# Altium footprint library DrPCB.PcbLib: 910 footprints (part 41 of 57)
Each footprint in its own frame and in the unit in brackets; x right, y up, seen from the top. Pads: shape width x height; smd on the part's side, far side on the other; paste and mask are expansions set on the pad; w line width, h text height; cw(c..) or ccw(c..) is an arc to the next point about the centre after c.
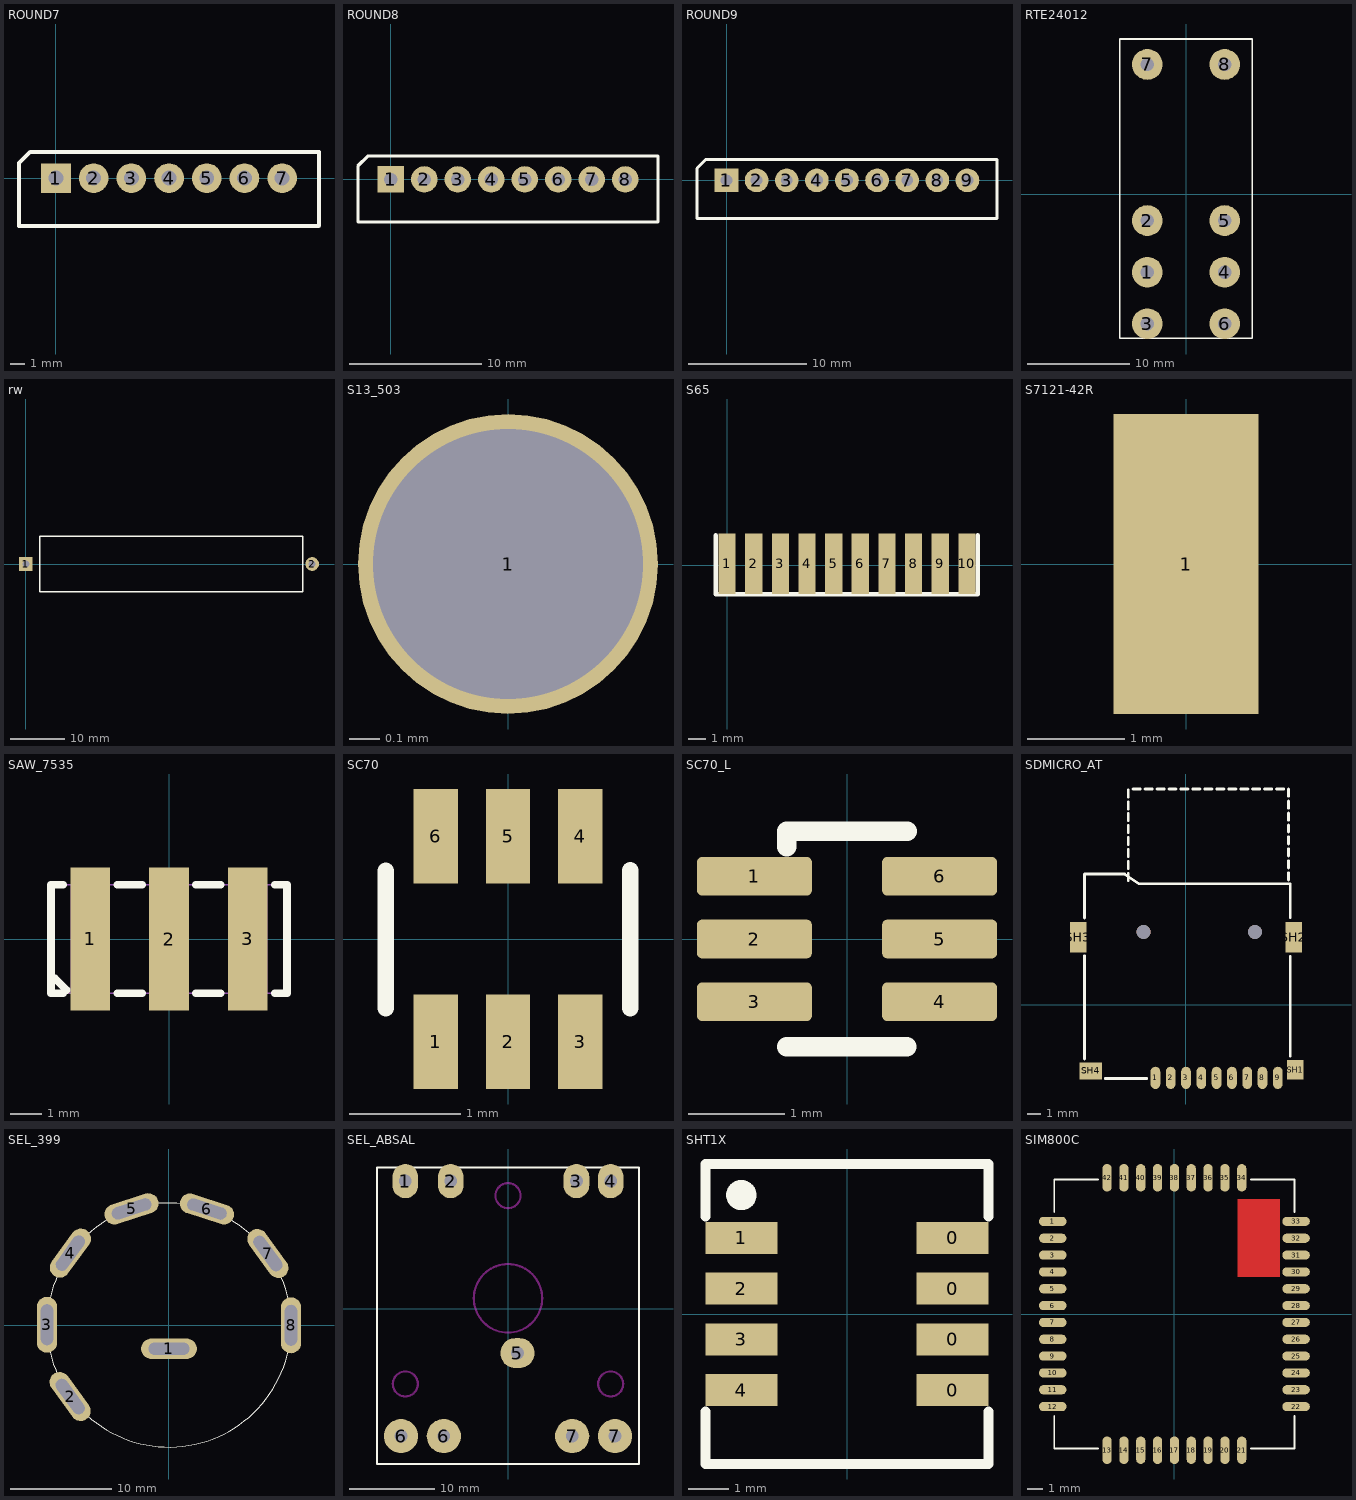
[diagram p40: the footprints below, top view; thin cyan lines are the x and y axes]

## ROUND7 [mm]
pads (7):
  rect 2x2 hole 1: 1(-0.004,-0.009)
  round 2 hole 1: 2(2.536,-0.009) 3(5.076,-0.009) 4(7.616,-0.009) 5(10.156,-0.009) 6(12.696,-0.009) 7(15.236,-0.009)
Top Overlay:
  lines w0.254: -2.492,-3.241 -2.492,1.008 -1.741,1.759 17.719,1.759 17.719,-3.223 17.701,-3.241 -2.492,-3.241

## ROUND8 [mm]
pads (8):
  rect 2x2 hole 1: 1(-0.004,0.004)
  round 2 hole 1: 2(2.536,0.004) 3(5.076,0.004) 4(7.616,0.004) 5(10.156,0.004) 6(12.696,0.004) 7(15.236,0.004) 8(17.776,0.004)
Top Overlay:
  lines w0.254: 20.244,-3.228 -2.492,-3.228 -2.492,1.021 -1.741,1.772 20.244,1.772 ; 20.259,-3.228 20.259,1.772

## ROUND9 [mm]
pads (9):
  rect 2x2 hole 1: 1(-0.004,0.004)
  round 2 hole 1: 2(2.536,0.004) 3(5.076,0.004) 4(7.616,0.004) 5(10.156,0.004) 6(12.696,0.004) 7(15.236,0.004) 8(17.776,0.004) 9(20.316,0.004)
Top Overlay:
  lines w0.254: 22.796,-3.228 -2.492,-3.228 -2.492,1.021 -1.741,1.772 22.809,1.772 ; 22.799,-3.228 22.799,1.772

## RTE24012 [mm]
pads (8):
  round 3 hole 1.3 mask+0: 1(-3.78,-7.63) 2(-3.78,-2.59) 3(-3.78,-12.67) 4(3.78,-7.63) 5(3.78,-2.59) 6(3.78,-12.67) 7(-3.78,12.67) 8(3.78,12.67)
Top Overlay:
  lines w0.152: -6.477,-14.102 6.477,-14.102 6.477,15.159 -6.477,15.159 -6.477,-14.102
3D body "RELAY-SPDT_5mm.step": height 15.7, standoff -2.54, extent -6.35,-13.975 6.35,15.032

## rw [mm]
pads (2):
  rect 2.5x2.5 hole 1.3: 1(0,0)
  round 2.5 hole 1.3: 2(52.5,0)
Top Overlay:
  lines w0.254: 2.54,-5.08 2.54,5.08 50.8,5.08 50.8,-5.08 2.54,-5.08

## S13_503 [mm]
pads (1):
  round 1 hole 0.9: 1(0,0)
3D body "s13-503.stp": height 12.6, standoff -5.15, extent -0.483,-0.483 0.483,0.483

## S65 [mm]
pads (10):
  rect 1x3.5 smd: 1(-0.021,0.1) 2(1.529,0.1) 3(3.079,0.1) 4(4.629,0.1) 5(6.179,0.1) 6(7.729,0.1) 7(9.279,0.1) 8(10.829,0.1) 9(12.379,0.1) 10(13.929,0.1)
Top Overlay:
  lines w0.254: -0.682,1.751 -0.682,-1.678 14.558,-1.678 14.558,1.751

## S7121-42R [mm]
pads (1):
  rect 1.5x3.1 smd: 1(0,0)
3D body "s7121-42r.stp": height 1.71, standoff 0.01, extent -0.75,-1.348 0.75,1.348

## SAW_7535 [mm]
pads (3):
  rect 1.28x4.6 smd paste+0 mask+0.05: 1(-2.54,0) 2(0,0) 3(2.54,0)
Top Overlay:
  lines w0.254: -3.81,-1.27 -3.683,-1.27 -3.302,-1.651 ; -3.411,-1.75 -3.81,-1.75 -3.81,1.75 -3.411,1.75 ; -1.669,-1.75 -0.871,-1.75 ; -1.669,1.75 -0.871,1.75 ; 0.871,-1.75 1.669,-1.75 ; 0.871,1.75 1.669,1.75 ; 3.411,-1.75 3.81,-1.75 3.81,1.75 3.411,1.75
Mechanical 15:
  region: 1.905,1.75 3.175,1.75 3.175,-1.75 1.905,-1.75
  region: -0.635,1.75 0.635,1.75 0.635,-1.75 -0.635,-1.75
  region: -3.175,1.75 -1.905,1.75 -1.905,-1.75 -3.175,-1.75
  region: -3.69,1.75 -3.69,1.775 -3.725,1.81 -3.775,1.81 -3.81,1.775 -3.81,1.75 -3.81,1.725 -3.775,1.69 -3.725,1.69 -3.69,1.725
  lines w0.051: -3.75,-1.75 3.75,-1.75 3.75,1.75 -3.75,1.75 -3.75,-1.75
3D body "User Library-CSTCC2M00GZ6A02-R0.step": height 1.25, standoff 0, extent -3.6,-1.5 3.6,1.5

## SC70 [mm]
pads (6):
  rect 0.4x0.85 smd: 1(-0.65,-0.925) 2(0,-0.925) 3(0.65,-0.925) 4(0.65,0.925) 5(0,0.925) 6(-0.65,0.925)
Top Overlay:
  lines w0.15: -1.1,-0.624 -1.1,0.613 ; 1.1,-0.624 1.1,0.62
3D body "User Library-SOT363-2.step": height 1.1, standoff 0, extent -1.1,-1.2 1.1,1.2

## SC70_L [mm]
pads (6):
  rrect25% 1.19x0.4 smd: 1(-0.96,0.65) 2(-0.96,0) 3(-0.96,-0.65) 4(0.96,-0.65) 5(0.96,0) 6(0.96,0.65)
Top Overlay:
  lines w0.2: -0.628,-1.118 0.622,-1.118 ; -0.625,0.955 -0.625,1.118 0.625,1.118
3D body "SN74LVC1T45DCKR--3DModel-STEP-1.STEP": height 1.1, standoff 0, extent -1.05,-1 1.05,1

## SDMICRO_AT [mm] "SDMICRO exist on Iran, Attend 112J-TDAR-R01 push-push"
height 1
pads (15):
  oval 0.7x1.6 smd: 1(-2.2,-5.25) 2(-1.1,-5.25) 3(0,-5.25) 4(1.1,-5.25) 5(2.2,-5.25) 6(3.3,-5.25) 7(4.4,-5.25) 8(5.5,-5.25) 9(6.6,-5.25)
  rect 1.2x1.4 smd: SH1(7.85,-4.65)
  rect 1.2x2.2 smd: SH2(7.75,4.85) SH3(-7.75,4.85)
  rect 1.6x1.2 smd: SH4(-6.85,-4.75)
  round 1 hole 1 unplated: ""(-3.05,5.25) ""(4.95,5.25)
Top Overlay:
  lines w0.2: -7.3,-3.9 -7.3,3.53 ; -7.3,6.25 -7.3,9.4 -4.409,9.4 -3.399,8.7 7.5,8.7 7.5,6.26 ; -5.8,-5.3 -2.82,-5.3 ; -4.16,8.93 -4.16,9.45 ; -4.16,9.79 -4.16,10.31 ; -4.16,10.65 -4.16,11.17 ; -4.16,11.51 -4.16,12.03 ; -4.16,12.37 -4.16,12.89 ; -4.16,13.23 -4.16,13.75 ; -4.16,14.09 -4.16,14.61 ; -4.16,14.95 -4.16,15.47 ; -3.81,15.52 -3.29,15.52 ; -2.95,15.52 -2.43,15.52 ; -2.09,15.52 -1.57,15.52 ; -1.23,15.52 -0.71,15.52 ; -0.37,15.52 0.15,15.52 ; 0.49,15.52 1.01,15.52 ; 1.35,15.52 1.87,15.52 ; 2.21,15.52 2.73,15.52 ; 3.07,15.52 3.59,15.52 ; 3.93,15.52 4.45,15.52 ; 4.79,15.52 5.31,15.52 ; 5.65,15.52 6.17,15.52 ; 6.51,15.52 7.03,15.52 ; 7.37,8.98 7.37,9.5 ; 7.37,9.84 7.37,10.36 ; 7.37,10.7 7.37,11.22 ; 7.37,11.56 7.37,12.08 ; 7.37,12.42 7.37,12.94 ; 7.37,13.28 7.37,13.8 ; 7.37,14.14 7.37,14.66 ; 7.37,15 7.37,15.52 ; 7.5,-3.7 7.5,3.5
3D body "112J-TXAR-R_C_1.stp": height 1.85, standoff -0.6, extent -8,-5.702 8.1,9.3
3D body "User Library-Micro_SD.step": height 1.15, standoff 0.17, extent -3.976,-1.179 7.024,13.821

## SEL_399 [mm]
pads (8):
  oval 5.5x2 hole 1.2 slot 4 at 0 deg: 1(0,-2.328)
  oval 5.5x2 hole 1.2 slot 4 at 126 deg rot 126: 2(-9.724,-7.034) 7(9.724,7.034)
  oval 2x5.5 hole 1.2 slot 4 at 90 deg: 3(-12.002,0.025) 8(12.002,-0.025)
  oval 5.5x2 hole 1.2 slot 4 at 54 deg rot 54: 4(-9.694,7.075)
  oval 5.5x2 hole 1.2 slot 4 at 18 deg rot 18: 5(-3.685,11.422)
  oval 5.5x2 hole 1.2 slot 4 at 162 deg rot 162: 6(3.733,11.406)
Top Overlay:
  circle w0.1: c0,0 r12

## SEL_ABSAL [mm]
pads (9):
  oval 3x4 hole 1.5: 1(-12,14.9) 2(-6.7,14.9) 3(8,14.9) 4(12,14.9)
  oval 4x3.5 hole 1.5: 5(1.1,-5.2)
  round 4 hole 1.5: 6(-12.5,-14.9) 6(-7.5,-14.9) 7(7.5,-14.9) 7(12.5,-14.9)
Top Overlay:
  lines w0.254: -15.3,-18.161 -15.3,16.5 15.3,16.5 15.3,-18.161 -15.3,-18.161
Keep-Out Layer:
  circle w0.254: c0,1.2 r4
  circle w0.254: c12,-8.8 r1.462
  circle w0.254: c-12,-8.8 r1.462
  circle w0.254: c0,13.2 r1.462
3D body: height 26.5, standoff 0, extent -15.342,-18.212 15.253,16.485
3D body: height 45, standoff 0, extent -15.342,1.486 15.253,16.485

## SHT1X [mm]
pads (8):
  rect 1.8x0.8 smd: 0(2.64,-1.905) 0(2.64,-0.635) 0(2.64,0.635) 0(2.64,1.905) 1(-2.64,1.905) 2(-2.64,0.635) 3(-2.64,-0.635) 4(-2.64,-1.905)
Top Overlay:
  circle w0.5: c-2.642,2.972 r0.128
  lines w0.254: -3.54,-2.442 -3.54,-3.75 3.54,-3.75 3.54,-2.442 ; -3.54,2.442 -3.54,3.75 3.54,3.75 3.54,2.442

## SIM800C [mm]
pads (42):
  oval 1.8x0.6 smd: 1(-7.95,6.05) 2(-7.95,4.95) 3(-7.95,3.85) 4(-7.95,2.75) 5(-7.95,1.65) 6(-7.95,0.55) 7(-7.95,-0.55) 8(-7.95,-1.65) 9(-7.95,-2.75) 10(-7.95,-3.85) 11(-7.95,-4.95) 12(-7.95,-6.05) 22(7.95,-6.05) 23(7.95,-4.95) 24(7.95,-3.85) 25(7.95,-2.75) 26(7.95,-1.65) 27(7.95,-0.55) 28(7.95,0.55) 29(7.95,1.65) 30(7.95,2.75) 31(7.95,3.85) 32(7.95,4.95) 33(7.95,6.05)
  oval 0.6x1.8 smd: 13(-4.4,-8.9) 14(-3.3,-8.9) 15(-2.2,-8.9) 16(-1.1,-8.9) 17(0,-8.9) 18(1.1,-8.9) 19(2.2,-8.9) 20(3.3,-8.9) 21(4.4,-8.9) 34(4.4,8.9) 35(3.3,8.9) 36(2.2,8.9) 37(1.1,8.9) 38(0,8.9) 39(-1.1,8.9) 40(-2.2,8.9) 41(-3.3,8.9) 42(-4.4,8.9)
Top Layer:
  pour cut-out: 6.871,7.506 4.153,7.506 4.153,2.438 6.871,2.438
  pour cut-out: 10.363,2.972
Top Overlay:
  lines w0.127: -7.85,-6.65 -7.85,-8.8 -5,-8.8 ; -7.85,6.65 -7.85,8.8 -5,8.8 ; 5,-8.8 7.85,-8.8 7.85,-6.65 ; 5,8.8 7.85,8.8 7.85,6.65
3D body "User Library-SIM800C-1.STEP": height 2.34, standoff 0, extent -7.851,-8.8 7.849,8.8